# Altium footprint library Capacitors.PcbLib: 93 footprints (part 6 of 6)
Each footprint in its own frame and in the unit in brackets; x right, y up, seen from the top. Pads: shape width x height; smd on the part's side, far side on the other; paste and mask are expansions set on the pad; w line width, h text height; cw(c..) or ccw(c..) is an arc to the next point about the centre after c.
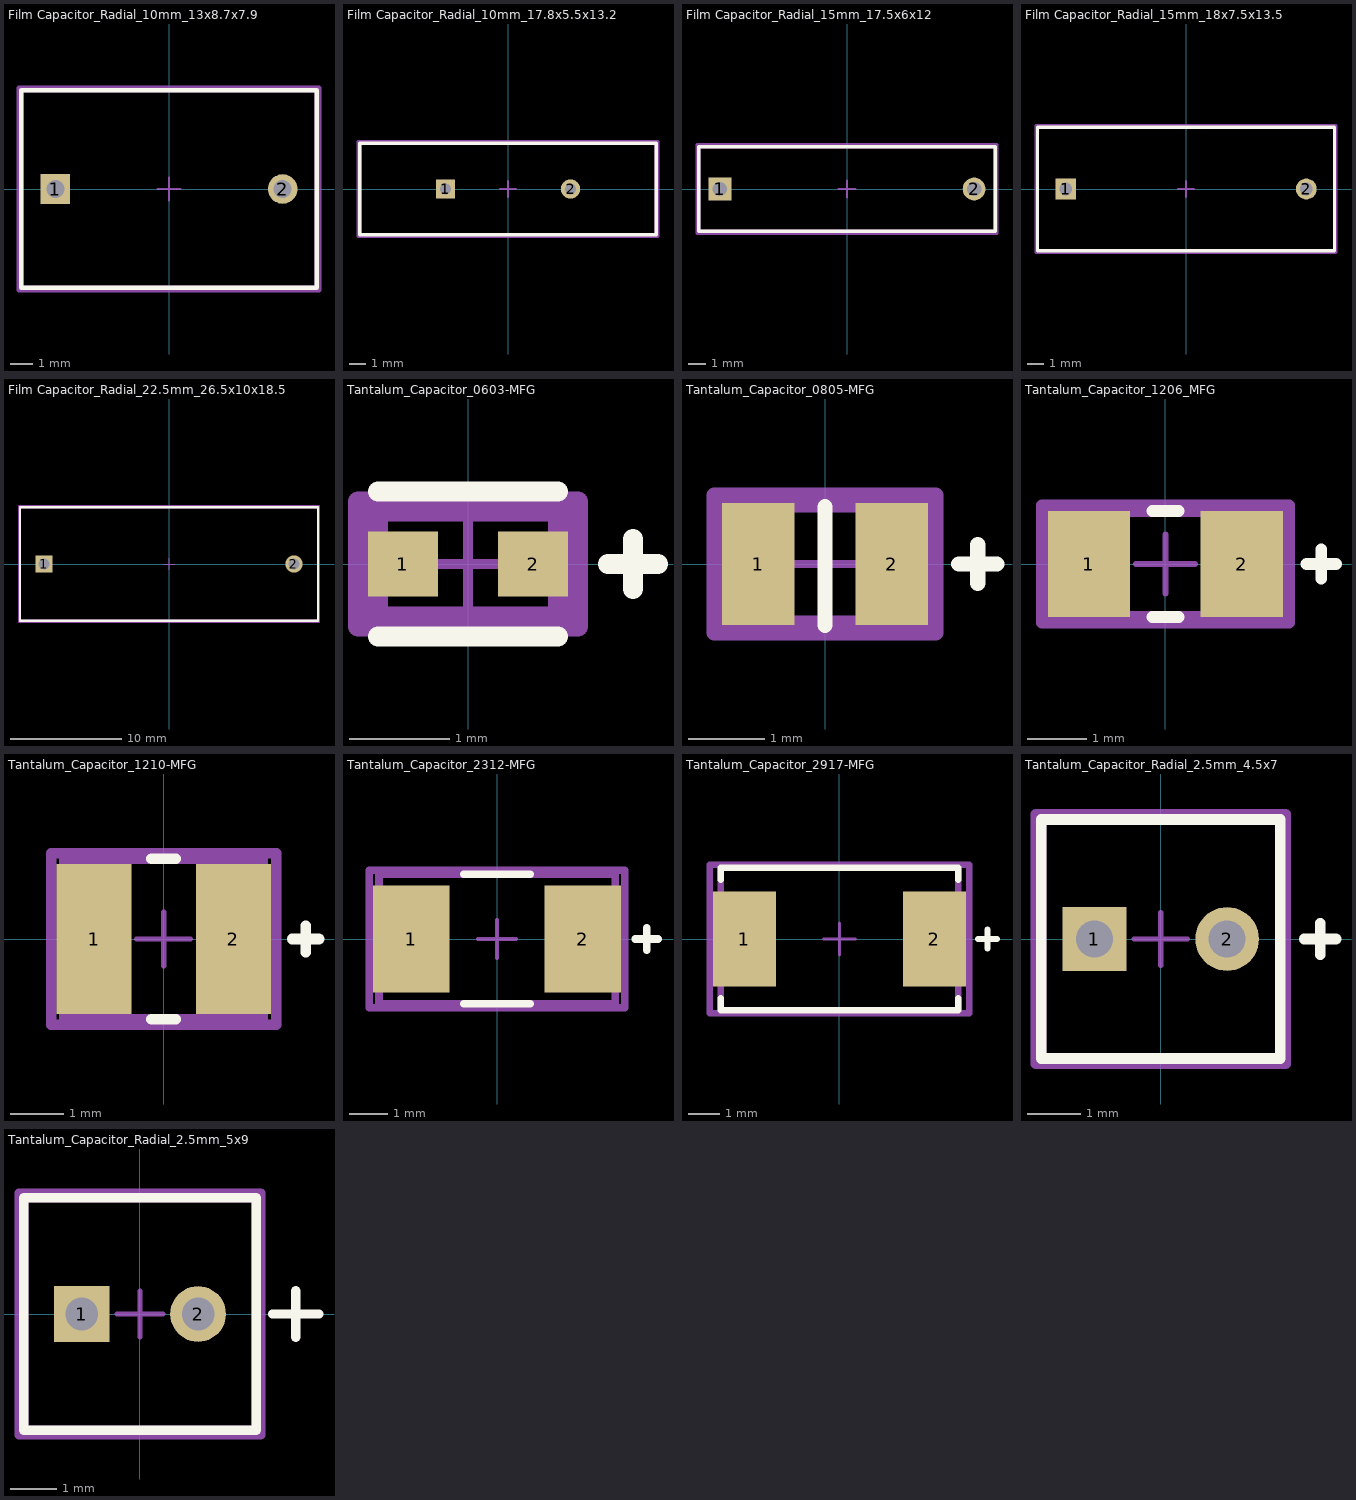
[diagram p5: the footprints below, top view; thin cyan lines are the x and y axes]

## Film Capacitor_Radial_10mm_13x8.7x7.9 [mm]
pads (2):
  rect 1.3x1.3 hole 0.8 paste-2539.97 mask+0: 1(-5,0)
  round 1.3 hole 0.8 paste-2539.97 mask+0: 2(5,0)
Top Overlay:
  lines w0.2: -6.5,-4.35 -6.5,4.35 6.5,4.35 6.5,-4.35 -6.5,-4.35
Top Assembly:
  lines w0.2: -6.6,-4.45 -6.6,4.45 6.6,4.45 6.6,-4.45 -6.6,-4.45
Top 3D Body:
  lines w0.2: -6.5,-4.35 -6.5,4.35 6.5,4.35 6.5,-4.35 -6.5,-4.35
Top Courtyard:
  lines w0.2: -6.6,-4.45 -6.6,4.45 6.6,4.45 6.6,-4.45 -6.6,-4.45
Top Component Center:
  lines w0.1: -0.5,0 0.5,0 ; 0,-0.5 0,0.5
3D body "Cap_Panasonic_ECWF2W474JAQ_eec.STEP": height 0.25, standoff 0, extent -6.6,-4.45 6.6,4.45

## Film Capacitor_Radial_10mm_17.8x5.5x13.2 [mm]
pads (2):
  rect 1.15x1.15 hole 0.65 paste-2539.97 mask+0: 1(-3.75,0)
  round 1.15 hole 0.65 paste-2539.97 mask+0: 2(3.75,0)
Top Overlay:
  lines w0.2: -8.9,-2.75 -8.9,2.75 8.9,2.75 8.9,-2.75 -8.9,-2.75
Top Assembly:
  lines w0.2: -9,-2.85 -9,2.85 9,2.85 9,-2.85 -9,-2.85
Top 3D Body:
  lines w0.2: -8.9,-2.75 -8.9,2.75 8.9,2.75 8.9,-2.75 -8.9,-2.75
Top Courtyard:
  lines w0.2: -9,-2.85 -9,2.85 9,2.85 9,-2.85 -9,-2.85
Top Component Center:
  lines w0.1: -0.5,0 0.5,0 ; 0,-0.5 0,0.5
3D body "Cap_Panasonic_Electronic_Components_ECW-HA3C122H4_eec.STEP": height 0.25, standoff 0, extent -9,-2.85 9,2.85

## Film Capacitor_Radial_15mm_17.5x6x12 [mm]
pads (2):
  rect 1.35x1.35 hole 0.85 paste-2539.97 mask+0: 1(-7.5,0)
  round 1.35 hole 0.85 paste-2539.97 mask+0: 2(7.5,0)
Top Overlay:
  lines w0.2: -8.75,-2.5 8.75,-2.5 8.75,2.5 -8.75,2.5 -8.75,-2.5
Top Assembly:
  lines w0.2: -8.85,-2.6 8.85,-2.6 8.85,2.6 -8.85,2.6 -8.85,-2.6
Top 3D Body:
  lines w0.2: -8.75,-2.5 8.75,-2.5 8.75,2.5 -8.75,2.5 -8.75,-2.5
Top Courtyard:
  lines w0.2: -8.85,-2.6 8.85,-2.6 8.85,2.6 -8.85,2.6 -8.85,-2.6
Top Component Center:
  lines w0.1: -0.5,0 0.5,0 ; 0,-0.5 0,0.5
3D body "Cap_Vishay_BFC233620104_eec.STEP": height 0.25, standoff 0, extent -8.85,-2.6 8.85,2.6

## Film Capacitor_Radial_15mm_18x7.5x13.5 [mm]
pads (2):
  rect 1.3x1.3 hole 0.8 paste-2539.97 mask+0: 1(-7.5,0)
  round 1.3 hole 0.8 paste-2539.97 mask+0: 2(7.5,0)
Top Overlay:
  lines w0.2: -9.25,-3.85 -9.25,3.85 9.25,3.85 9.25,-3.85 -9.25,-3.85
Top Assembly:
  lines w0.2: -9.35,-3.95 -9.35,3.95 9.35,3.95 9.35,-3.95 -9.35,-3.95
Top 3D Body:
  lines w0.2: -9.25,-3.85 -9.25,3.85 9.25,3.85 9.25,-3.85 -9.25,-3.85
Top Courtyard:
  lines w0.2: -9.35,-3.95 -9.35,3.95 9.35,3.95 9.35,-3.95 -9.35,-3.95
Top Component Center:
  lines w0.1: -0.5,0 0.5,0 ; 0,-0.5 0,0.5
3D body "Cap_Kemet_R71MI3470AA00K_eec.STEP": height 0.25, standoff 0, extent -9.35,-3.95 9.35,3.95

## Film Capacitor_Radial_22.5mm_26.5x10x18.5 [mm]
pads (2):
  rect 1.55x1.55 hole 1 paste-2539.97 mask+0: 1(-11.25,0)
  round 1.55 hole 1 paste-2539.97 mask+0: 2(11.25,0)
Top Overlay:
  lines w0.2: -13.4,-5.1 13.4,-5.1 13.4,5.1 -13.4,5.1 -13.4,-5.1
Top Assembly:
  lines w0.2: -13.5,-5.2 13.5,-5.2 13.5,5.2 -13.5,5.2 -13.5,-5.2
Top 3D Body:
  lines w0.2: -13.4,-5.1 13.4,-5.1 13.4,5.1 -13.4,5.1 -13.4,-5.1
Top Courtyard:
  lines w0.2: -13.5,-5.2 13.5,-5.2 13.5,5.2 -13.5,5.2 -13.5,-5.2
Top Component Center:
  lines w0.1: -0.5,0 0.5,0 ; 0,-0.5 0,0.5
3D body "Cap_KEMET_R46KN4100JHN2M_eec.STEP": height 0.25, standoff 0, extent -13.5,-5.2 13.5,5.2

## Tantalum_Capacitor_0603-MFG [mm]
pads (2):
  rect 0.7x0.65 smd paste+0 mask+0: 1(-0.65,0) 2(0.65,0)
Top Overlay:
  lines w0.2: -0.9,-0.725 0.9,-0.725 ; -0.9,0.725 0.9,0.725 ; 1.4,0 1.9,0 ; 1.65,-0.25 1.65,0.25
Top Assembly:
  lines w0.2: -1.1,-0.625 -1.1,0.625 1.1,0.625 1.1,-0.625 -1.1,-0.625
  text ".Designator" at 0,0 h1
Top 3D Body:
  lines w0.2: -0.9,-0.525 -0.9,0.525 0.9,0.525 0.9,-0.525 -0.9,-0.525
Top Courtyard:
  lines w0.2: -1.1,-0.625 -1.1,0.625 1.1,0.625 1.1,-0.625 -1.1,-0.625
Top Component Center:
  lines w0.1: -0.5,0 0.5,0 ; 0,-0.5 0,0.5
3D body "Cap_AVX_Corporation_F981A106MMA_eec.STEP": height 0.25, standoff 0, extent -1.1,-0.625 1.1,0.625

## Tantalum_Capacitor_0805-MFG [mm]
pads (2):
  rect 0.95x1.6 smd paste+0 mask+0: 1(-0.875,0) 2(0.875,0)
Top Overlay:
  lines w0.2: 0,-0.8 0,0.75 ; 1.75,0 2.25,0 ; 2,-0.25 2,0.25
Top Assembly:
  lines w0.2: -1.45,-0.9 1.45,-0.9 1.45,0.9 -1.45,0.9 -1.45,-0.9
  text ".Designator" at 0,0 h1
Top 3D Body:
  lines w0.2: -1.125,-0.775 1.125,-0.775 1.125,0.775 -1.125,0.775 -1.125,-0.775
Top Courtyard:
  lines w0.2: -1.45,-0.9 1.45,-0.9 1.45,0.9 -1.45,0.9 -1.45,-0.9
Top Component Center:
  lines w0.1: -0.5,0 0.5,0 ; 0,-0.5 0,0.5
3D body "Cap_AVX_TAJP685M010RNJ_eec.STEP": height 0.25, standoff 0, extent -1.45,-0.9 1.45,0.9

## Tantalum_Capacitor_1206_MFG [mm]
pads (2):
  rect 1.4x1.8 smd paste+0 mask+0: 1(-1.3,0) 2(1.3,0)
Top Overlay:
  lines w0.2: -0.225,-0.9 0.225,-0.9 ; -0.225,0.9 0.225,0.9 ; 2.4,0 2.9,0 ; 2.65,-0.25 2.65,0.25
Top Assembly:
  lines w0.2: -2.1,-1 2.1,-1 2.1,1 -2.1,1 -2.1,-1
  text ".Designator" at 0,0 h1
Top 3D Body:
  lines w0.2: -1.7,-0.9 1.7,-0.9 1.7,0.9 -1.7,0.9 -1.7,-0.9
Top Courtyard:
  lines w0.2: -2.1,-1 2.1,-1 2.1,1 -2.1,1 -2.1,-1
Top Component Center:
  lines w0.1: -0.5,0 0.5,0 ; 0,-0.5 0,0.5
3D body "Cap_AVX_TAJA476K002RNJ_eec.STEP": height 0.25, standoff 0, extent -2.1,-1 2.1,1

## Tantalum_Capacitor_1210-MFG [mm]
pads (2):
  rect 1.4x2.8 smd paste+0 mask+0: 1(-1.3,0) 2(1.3,0)
Top Overlay:
  lines w0.2: -0.225,-1.5 0.225,-1.5 ; -0.225,1.5 0.225,1.5 ; 2.4,0 2.9,0 ; 2.65,-0.25 2.65,0.25
Top Assembly:
  lines w0.2: -2.1,-1.6 -2.1,1.6 2.1,1.6 2.1,-1.6 -2.1,-1.6
  text ".Designator" at 0,0 h1
Top 3D Body:
  lines w0.2: -1.85,-1.5 -1.85,1.5 1.85,1.5 1.85,-1.5 -1.85,-1.5
Top Courtyard:
  lines w0.2: -2.1,-1.6 -2.1,1.6 2.1,1.6 2.1,-1.6 -2.1,-1.6
Top Component Center:
  lines w0.1: -0.5,0 0.5,0 ; 0,-0.5 0,0.5
3D body "Cap_AVX_TAJB335M035RNJ_eec.STEP": height 0.25, standoff 0, extent -2.1,-1.6 2.1,1.6

## Tantalum_Capacitor_2312-MFG [mm]
pads (2):
  rect 2x2.8 smd paste+0 mask+0: 1(-2.25,0) 2(2.25,0)
Top Overlay:
  lines w0.2: -0.875,-1.7 0.875,-1.7 ; -0.875,1.7 0.875,1.7 ; 3.625,0 4.225,0 ; 3.925,-0.3 3.925,0.3
Top Assembly:
  lines w0.2: -3.35,-1.8 -3.35,1.8 3.35,1.8 3.35,-1.8 -3.35,-1.8
  text ".Designator" at 0,0 h1
Top 3D Body:
  lines w0.2: -3.1,-1.7 -3.1,1.7 3.1,1.7 3.1,-1.7 -3.1,-1.7
Top Courtyard:
  lines w0.2: -3.35,-1.8 -3.35,1.8 3.35,1.8 3.35,-1.8 -3.35,-1.8
Top Component Center:
  lines w0.1: -0.5,0 0.5,0 ; 0,-0.5 0,0.5
3D body "Cap_AVX_TAJC157M006TNJ_eec.STEP": height 0.25, standoff 0, extent -3.35,-1.8 3.35,1.8

## Tantalum_Capacitor_2917-MFG [mm]
pads (2):
  rect 2x3 smd paste+0 mask+0: 1(-3,0) 2(3,0)
Top Overlay:
  lines w0.2: -3.75,-1.875 -3.75,-2.25 3.75,-2.25 3.75,-1.875 ; -3.75,1.875 -3.75,2.25 3.75,2.25 3.75,1.875 ; 4.375,0 4.975,0 ; 4.675,-0.3 4.675,0.3
Top Assembly:
  lines w0.2: -4.1,-2.35 4.1,-2.35 4.1,2.35 -4.1,2.35 -4.1,-2.35
  text ".Designator" at 0,0 h1
Top 3D Body:
  lines w0.2: -3.75,-2.25 3.75,-2.25 3.75,2.25 -3.75,2.25 -3.75,-2.25
Top Courtyard:
  lines w0.2: -4.1,-2.35 4.1,-2.35 4.1,2.35 -4.1,2.35 -4.1,-2.35
Top Component Center:
  lines w0.1: -0.5,0 0.5,0 ; 0,-0.5 0,0.5
3D body "Cap_AVX_TAJD108K004RNJ_eec.STEP": height 0.25, standoff 0, extent -4.1,-2.35 4.1,2.35

## Tantalum_Capacitor_Radial_2.5mm_4.5x7 [mm]
pads (2):
  rect 1.2x1.2 hole 0.7 paste-2539.97 mask+0: 1(-1.25,0)
  round 1.2 hole 0.7 paste-2539.97 mask+0: 2(1.25,0)
Top Overlay:
  lines w0.2: 2.7,0 3.3,0 ; 3,-0.3 3,0.3 ; -2.25,-2.25 2.25,-2.25 2.25,2.25 -2.25,2.25 -2.25,-2.25
Top Assembly:
  lines w0.2: -2.35,-2.35 2.35,-2.35 2.35,2.35 -2.35,2.35 -2.35,-2.35
Top 3D Body:
  lines w0.2: -2.25,-2.25 2.25,-2.25 2.25,2.25 -2.25,2.25 -2.25,-2.25
Top Courtyard:
  lines w0.2: -2.35,-2.35 2.35,-2.35 2.35,2.35 -2.35,2.35 -2.35,-2.35
Top Component Center:
  lines w0.1: -0.5,0 0.5,0 ; 0,-0.5 0,0.5
3D body "Cap_AVX_Corporation_TAP105K035SCS_eec.STEP": height 0.25, standoff 0, extent -2.35,-2.35 2.35,2.35

## Tantalum_Capacitor_Radial_2.5mm_5x9 [mm]
pads (2):
  rect 1.2x1.2 hole 0.7 paste-2539.97 mask+0: 1(-1.25,0)
  round 1.2 hole 0.7 paste-2539.97 mask+0: 2(1.25,0)
Top Overlay:
  lines w0.2: 2.85,0 3.85,0 ; 3.35,-0.5 3.35,0.5 ; -2.5,-2.5 2.5,-2.5 2.5,2.5 -2.5,2.5 -2.5,-2.5
Top Assembly:
  lines w0.2: -2.6,-2.6 2.6,-2.6 2.6,2.6 -2.6,2.6 -2.6,-2.6
Top 3D Body:
  lines w0.2: -2.5,-2.5 2.5,-2.5 2.5,2.5 -2.5,2.5 -2.5,-2.5
Top Courtyard:
  lines w0.2: -2.6,-2.6 2.6,-2.6 2.6,2.6 -2.6,2.6 -2.6,-2.6
Top Component Center:
  lines w0.1: -0.5,0 0.5,0 ; 0,-0.5 0,0.5
3D body "Cap_AVX_Corporation_TAP106K016SCS_eec.STEP": height 0.25, standoff 0, extent -2.6,-2.6 2.6,2.6